# Altium integrated library 兰格封装.IntLib: 1176 symbols (part 4 of 6)
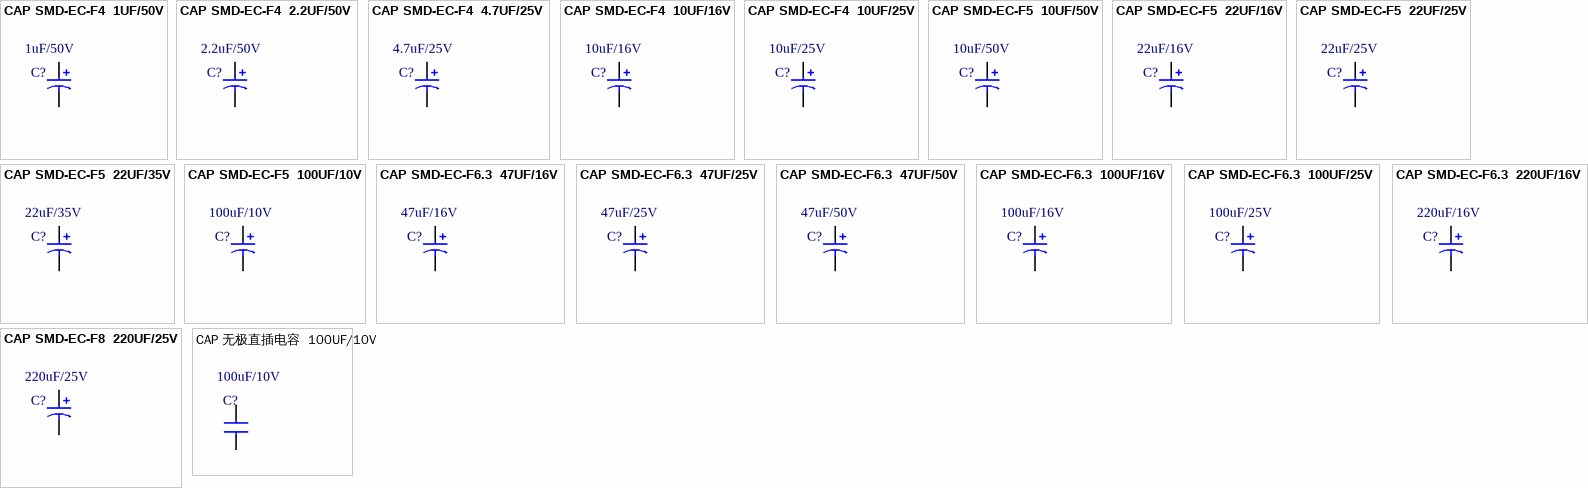
[diagram p51: symbols CAP SMD-EC-F4  1UF/50V to CAP 无极直插电容  100UF/10V]

## CAP SMD-EC-F5  22UF/25V
designator C?, comment 22uF/25V
22UF/25V  贴片铝电容; 物料代码: 3.01.02.02.04.0018; 规格型号: 5*5.4; 助记码: 22UF/25V  TPLDR; 仓库名称: 元件仓; 单位: ֻ; 加工方式: 贴片; 物料名称: 22UF/25V  贴片铝电容
footprint SMD-EC-F5 (0.20 in)
pins: 1, 2
1 alternate drawing of the same symbol

## CAP SMD-EC-F5  22UF/35V
designator C?, comment 22uF/35V
（查不到）22UF/35V  贴片铝电容; 加工方式: 贴片; 仓库名称: 元件仓; 单位: ֻ; 物料代码: *; 物料名称: *; 助记码: *; 规格型号: *; 备注: *
footprint SMD-EC-F5 (0.20 in)
pins: 1, 2
1 alternate drawing of the same symbol

## CAP SMD-EC-F5  100UF/10V
designator C?, comment 100uF/10V
100UF/10V  贴片铝电容; 助记码: 100UF/10V  TPLDR; 物料代码: 3.01.02.02.04.0016; 仓库名称: 元件仓; 规格型号: 5*5.4; 单位: ֻ; 加工方式: 贴片; 物料名称: 100UF/10V  贴片铝电容
footprint SMD-EC-F5 (0.20 in)
pins: 1, 2
1 alternate drawing of the same symbol

## CAP SMD-EC-F6.3  47UF/16V
designator C?, comment 47uF/16V
47UF/16V  贴片铝电容; 助记码: 47UF/16V  TPLDR; 物料代码: 3.01.02.02.04.0013; 仓库名称: 元件仓; 规格型号: 6.3*5.4; 单位: ֻ; 加工方式: 贴片; 物料名称: 47UF/16V  贴片铝电容
footprint SMD-EC-F6.3 (0.26 in)
pins: 1, 2
1 alternate drawing of the same symbol

## CAP SMD-EC-F6.3  47UF/25V
designator C?, comment 47uF/25V
47UF/25V  贴片铝电容; 物料代码: 3.01.02.02.04.0002; 助记码: 47UF/25V  TPLDR; 规格型号: 6.3*5.4; 仓库名称: 元件仓; 单位: ֻ; 加工方式: 贴片; 物料名称: 47UF/25V  贴片铝电容
footprint SMD-EC-F6.3 (0.26 in)
pins: 1, 2
1 alternate drawing of the same symbol

## CAP SMD-EC-F6.3  47UF/50V
designator C?, comment 47uF/50V
47UF/50V  贴片铝电容; 物料代码: 3.01.02.02.04.0011; 规格型号: 6.3*7; 助记码: 47UF/50V  TPLDR; 仓库名称: 元件仓; 单位: ֻ; 加工方式: 贴片; 物料名称: 47UF/50V  贴片铝电容
footprint SMD-EC-F6.3 (0.26 in)
pins: 1, 2
1 alternate drawing of the same symbol

## CAP SMD-EC-F6.3  100UF/16V
designator C?, comment 100uF/16V
100UF/16V  贴片铝电容; 物料代码: 3.01.02.02.04.0014; 助记码: 100UF/16V  TPLDR; 规格型号: 6.3*5.4; 仓库名称: 元件仓; 单位: ֻ; 加工方式: 贴片; 物料名称: 100UF/16V  贴片铝电容
footprint SMD-EC-F6.3 (0.26 in)
pins: 1, 2
1 alternate drawing of the same symbol

## CAP SMD-EC-F6.3  100UF/25V
designator C?, comment 100uF/25V
100UF/25V  贴片铝电容; 物料代码: 3.01.02.02.04.0008; 规格型号: 6.3*7; 助记码: 100UF/25V  TPLDR; 仓库名称: 元件仓; 单位: ֻ; 加工方式: 贴片; 物料名称: 100UF/25V  贴片铝电容
footprint SMD-EC-F6.3 (0.26 in)
pins: 1, 2
1 alternate drawing of the same symbol

## CAP SMD-EC-F6.3  220UF/16V
designator C?, comment 220uF/16V
220UF/16V  贴片铝电容; 物料代码: 3.01.02.02.04.0017; 规格型号: 6.3*7; 助记码: 220UF/16V  TPLDR; 仓库名称: 元件仓; 单位: ֻ; 加工方式: 贴片; 物料名称: 220UF/16V  贴片铝电容
footprint SMD-EC-F6.3 (0.26 in)
pins: 1, 2
1 alternate drawing of the same symbol

## CAP SMD-EC-F8  220UF/25V
designator C?, comment 220uF/25V
220UF/25V  贴片铝电容; 物料代码: 3.01.02.02.04.0009; 规格型号: 6.3*7; 助记码: 220UF/25V  TPLDR; 仓库名称: 元件仓; 单位: ֻ; 加工方式: 贴片; 物料名称: 220UF/25V  贴片铝电容
footprint SMD-EC-F8 (0.33 in        8*10.2)
pins: 1, 2
1 alternate drawing of the same symbol

## CAP 无极直插电容  100UF/10V
designator C?, comment 100uF/10V
100UF/10V  无极直插电容; 仓库名称: 元件仓; 单位: ֻ; 加工方式: 插件; 物料名称: 100UF/10V  无极直插电容
footprint CAP 5mm
pins: 1, 2
1 alternate drawing of the same symbol


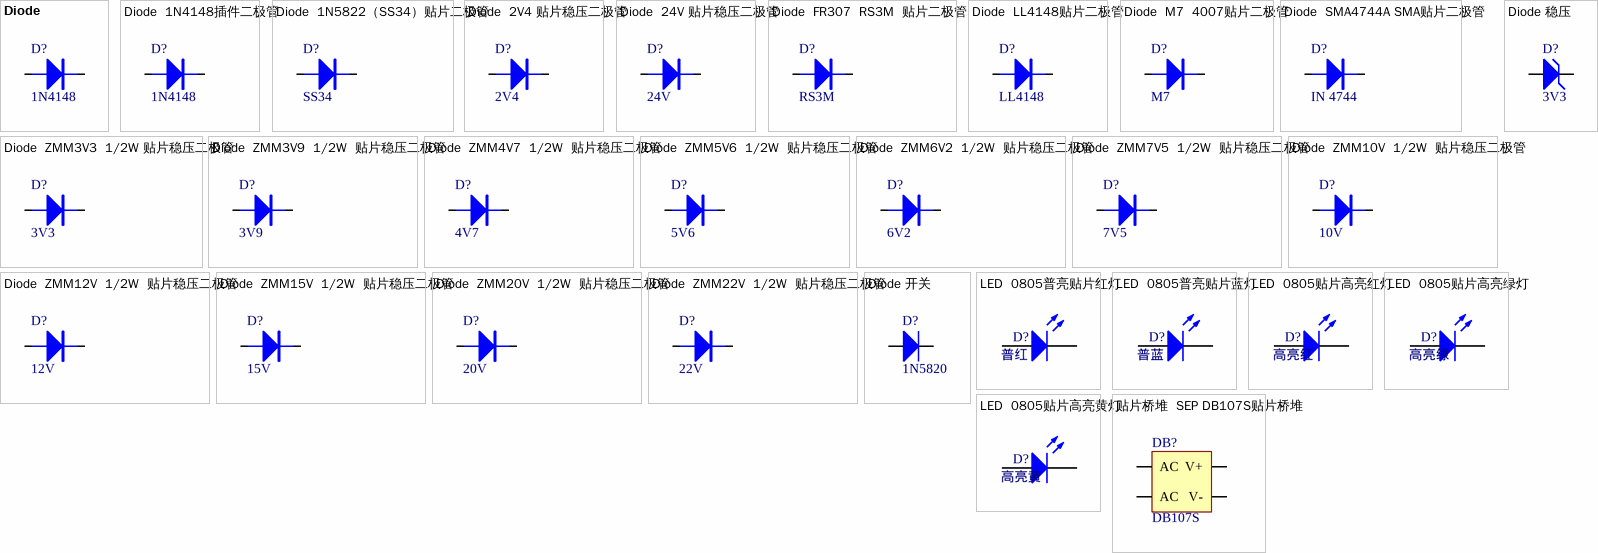
[diagram p32: symbols Diode to 贴片桥堆  SEP DB107S贴片桥堆]

## Diode
designator D?, comment 1N4148
二极管（模板）; 单位: ֻ; 仓库名称: 元件仓; 加工方式: 贴片; 规格型号: *
pins: 1, 2

## Diode  1N4148插件二极管
designator D?, comment 1N4148
1N4148插件二极管; 单位: ֻ; 仓库名称: 元件仓; 加工方式: 插件
footprint IN 34
pins: 1, 2

## Diode  1N5822（SS34）贴片二极管
designator D?, comment SS34
1N5822（SS34）贴片二极管; 单位: ֻ; 规格型号: DO-214AC（SMA）; 物料代码: 3.01.05.02.0029; 助记码: 1N5822（SS34）TPEJG; 仓库名称: 元件仓; 加工方式: 贴片; 物料名称: 1N5822（SS34）贴片二极管
footprint DO-214AC (这是贴片二极管 1A)
pins: 1, 2

## Diode  2V4 贴片稳压二极管
designator D?, comment 2V4
2V4 贴片稳压二极管; 单位: ֻ; 物料代码: 3.01.05.02.0014; 助记码: 2V4 WYEJG; 仓库名称: 元件仓; 加工方式: 贴片; 规格型号: *; 物料名称: 2V4 贴片稳压二极管
footprint LL 34
pins: 1, 2

## Diode  24V 贴片稳压二极管
designator D?, comment 24V
24V 贴片稳压二极管; 单位: ֻ; 物料代码: 3.01.05.02.0013; 助记码: 20V WYEJG; 仓库名称: 元件仓; 加工方式: 贴片; 规格型号: *; 物料名称: 24V 贴片稳压二极管
footprint LL 34
pins: 1, 2

## Diode  FR307  RS3M  贴片二极管
designator D?, comment RS3M
FR307  RS3M  贴片二极管; 单位: ֻ; 规格型号: SMC/DO-214AA; 物料代码: 3.01.05.02.0012; 助记码: FR307  RS3M  TPEJG; 仓库名称: 元件仓; 加工方式: 贴片; 物料名称: FR307  RS3M  贴片二极管
footprint SMC (7.1x5.9*2.3mm（长宽高，不包括引脚）)
pins: 1, 2

## Diode  LL4148贴片二极管
designator D?, comment LL4148
LL4148贴片二极管; 单位: ֻ; 规格型号: LL-34; 物料名称: 1N4148贴片二极管; 物料代码: 3.01.05.02.0004; 助记码: 1N4148TPEJG; 仓库名称: 元件仓; 加工方式: 贴片
footprint LL 34
pins: 1, 2

## Diode  M7  4007贴片二极管
designator D?, comment M7
M7  4007贴片二极管; 单位: ֻ; 规格型号: DO-214; 物料代码: 3.01.05.02.0002; 助记码: M7  4007TPEJG; 仓库名称: 元件仓; 加工方式: 贴片; 物料名称: M7  4007贴片二极管
footprint M7
pins: 1, 2

## Diode  SMA4744A SMA贴片二极管
designator D?, comment IN 4744
SMA4744A SMA贴片二极管; 单位: ֻ; 规格型号: SMA/DO-214AC; 物料代码: 3.01.05.02.0003; 仓库名称: 元件仓; 加工方式: 贴片; 物料名称: SMA4744A SMA贴片二极管
footprint SMA (4.5x2.6*2.2mm（长宽高，不包括引脚）)
pins: 1, 2

## Diode  ZMM3V3  1/2W 贴片稳压二极管
designator D?, comment 3V3
ZMM3V3  1/2W 贴片稳压二极管; 单位: ֻ; 规格型号: LL-34; 物料代码: 3.01.05.02.0001; 仓库名称: 元件仓; 加工方式: 贴片; 物料名称: ZMM3V3  1/2W 贴片稳压二极管
footprint LL 34
pins: 1, 2

## Diode  ZMM3V9  1/2W  贴片稳压二极管
designator D?, comment 3V9
ZMM3V9　1/2W  贴片稳压二极管; 单位: ֻ; 规格型号: LL-34; 物料代码: 3.01.05.02.0005; 助记码: ZMM3V9　1/2W  TPWYEJ; 仓库名称: 元件仓; 加工方式: 贴片; 物料名称: ZMM3V9　1/2W  贴片稳压二极管
footprint LL 34
pins: 1, 2

## Diode  ZMM4V7  1/2W  贴片稳压二极管
designator D?, comment 4V7
ZMM4V7  1/2W  贴片稳压二极管; 单位: ֻ; 规格型号: LL-34; 物料代码: 3.01.05.02.0006; 助记码: ZMM4V7  1/2W  TPWYEJ; 仓库名称: 元件仓; 加工方式: 贴片; 物料名称: ZMM4V7  1/2W  贴片稳压二极管
footprint LL 34
pins: 1, 2

## Diode  ZMM5V6  1/2W  贴片稳压二极管
designator D?, comment 5V6
ZMM5V6  1/2W  贴片稳压二极管; 单位: ֻ; 规格型号: LL-34; 物料代码: 3.01.05.02.0025; 助记码: ZMM5V6  1/2W  TPWYEJ; 仓库名称: 元件仓; 加工方式: 贴片; 物料名称: ZMM5V6  1/2W  贴片稳压二极管
footprint LL 34
pins: 1, 2

## Diode  ZMM6V2  1/2W  贴片稳压二极管
designator D?, comment 6V2
ZMM6V2  1/2W  贴片稳压二极管; 单位: ֻ; 规格型号: LL-34; 物料代码: 3.01.05.02.0007; 助记码: ZMM6V2  1/2W  TPWYEJ; 仓库名称: 元件仓; 加工方式: 贴片; 物料名称: ZMM6V2  1/2W  贴片稳压二极管
footprint LL 34
pins: 1, 2

## Diode  ZMM7V5  1/2W  贴片稳压二极管
designator D?, comment 7V5
（查不到）ZMM7V5  1/2W  贴片稳压二极管; 单位: ֻ; 物料名称: ZMM10V  1/2W  贴片稳压二极管; 仓库名称: 元件仓; 加工方式: 贴片; 规格型号: *
footprint LL 34
pins: 1, 2

## Diode  ZMM10V  1/2W  贴片稳压二极管
designator D?, comment 10V
ZMM10V  1/2W  贴片稳压二极管; 单位: ֻ; 规格型号: LL-34; 物料代码: 3.01.05.02.0008; 助记码: ZMM10V  1/2W  TPWYEJ; 仓库名称: 元件仓; 加工方式: 贴片; 物料名称: ZMM10V  1/2W  贴片稳压二极管
footprint LL 34
pins: 1, 2

## Diode  ZMM12V  1/2W  贴片稳压二极管
designator D?, comment 12V
（查不到）ZMM12V  1/2W  贴片稳压二极管; 单位: ֻ; 仓库名称: 元件仓; 加工方式: 贴片; 规格型号: *; 物料名称: ZMM12V  1/2W  贴片稳压二极管
footprint LL 34
pins: 1, 2

## Diode  ZMM15V  1/2W  贴片稳压二极管
designator D?, comment 15V
（查不到）ZMM15V  1/2W  贴片稳压二极管; 单位: ֻ; 仓库名称: 元件仓; 加工方式: 贴片; 规格型号: *; 物料名称: ZMM15V  1/2W  贴片稳压二极管
footprint LL 34
pins: 1, 2

## Diode  ZMM20V  1/2W  贴片稳压二极管
designator D?, comment 20V
ZMM20V  1/2W  贴片稳压二极管; 单位: ֻ; 规格型号: LL-34; 物料代码: 3.01.05.02.0009; 助记码: ZMM20V  1/2W  TPWYEJ; 仓库名称: 元件仓; 加工方式: 贴片; 物料名称: ZMM20V  1/2W  贴片稳压二极管
footprint LL 34
pins: 1, 2

## Diode  ZMM22V  1/2W  贴片稳压二极管
designator D?, comment 22V
ZMM22V  1/2W  贴片稳压二极管; 单位: ֻ; 规格型号: LL-34; 物料代码: 3.01.05.02.0010; 助记码: ZMM22V  1/2W  TPWYEJ; 仓库名称: 元件仓; 加工方式: 贴片; 物料名称: ZMM22V  1/2W  贴片稳压二极管
footprint LL 34
pins: 1, 2

## Diode 开关
designator D?, comment 1N5820
玻封二极管（模板）; 加工方式: 贴片
footprint D 0805
pins: 1, 2

## Diode 稳压
designator D?, comment 3V3
玻封二极管（模板）; Published: 8-Jun-2000; Revision: July-2002: Re-released for DXP Platform.; Publisher: Altium Limited
footprint LL 34
pins: 1, 2

## LED  0805普亮贴片红灯
designator D?, comment 普红
0805普亮贴片红灯; 单位: ֻ; 物料代码: 3.01.13.01.0001; 助记码: 0805PLTPHD; 仓库名称: 元件仓; 加工方式: 贴片; 物料名称: 0805普亮贴片红灯; 规格型号: *
footprint LED 0805 (普通亮度，高亮绿灯用)
pins: 1 A, 2 K

## LED  0805普亮贴片蓝灯
designator D?, comment 普蓝
0805普亮贴片蓝灯; 单位: ֻ; 仓库名称: 元件仓; 加工方式: 贴片; 物料名称: 0805普亮贴片蓝灯; 规格型号: *
footprint LED 0805 (普通亮度，高亮绿灯用)
pins: 1 A, 2 K

## LED  0805贴片高亮红灯
designator D?, comment 高亮红
0805贴片高亮红灯; 单位: ֻ; 物料代码: 3.01.13.01.0005; 助记码: 0805TPGLHD; 规格型号: E6U0805URAC1UDA; 仓库名称: 元件仓; 加工方式: 贴片; 物料名称: 0805贴片高亮红灯
footprint LED 0805   反极性 (极性相反；高亮红，高亮黄专用)
pins: 1 A, 2 K

## LED  0805贴片高亮绿灯
designator D?, comment 高亮绿
0805贴片高亮绿灯; 单位: ֻ; 仓库名称: 元件仓; 加工方式: 贴片; 物料名称: 0805贴片高亮绿灯; 规格型号: *
footprint LED 0805 (普通亮度，高亮绿灯用)
pins: 1 A, 2 K

## LED  0805贴片高亮黄灯
designator D?, comment 高亮黄
0805贴片高亮黄灯; 单位: ֻ; 仓库名称: 元件仓; 加工方式: 贴片; 物料名称: 0805贴片高亮黄灯; 规格型号: *
footprint LED 0805   反极性 (极性相反；高亮红，高亮黄专用)
pins: 1 A, 2 K

## 贴片桥堆  SEP DB107S贴片桥堆
designator DB?, comment DB107S
SEP DB107S贴片桥堆; 物料代码: 3.01.17.02.0001; 助记码: SOP-4; 规格型号: SEP DB107STPQD; 仓库名称: 元件仓; 单位: ֻ; 加工方式: 贴片; 物料名称: SEP DB107S贴片桥堆; 备注: *
footprint SOP-4 (贴片桥堆DB107S)
pins: 1 AC, 2 AC, 3 V+, 4 V-


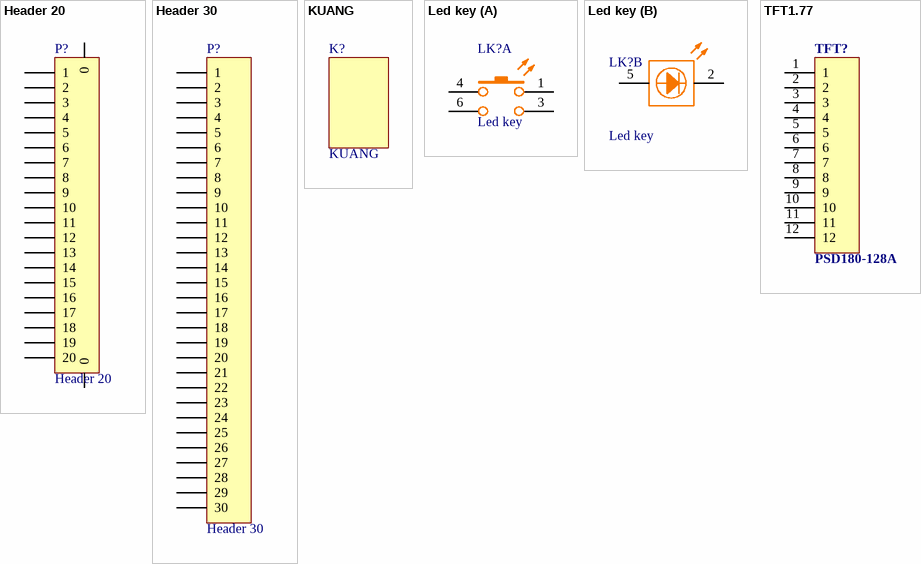
[diagram p33: symbols Header 20 to TFT1.77]

## Header 20
designator P?
Header, 20-Pin; LatestRevisionDate: 17-Jul-2002; LatestRevisionNote: Re-released for DXP Platform.; Publisher: Altium Limited
footprint 2.2寸 (3600 disp II)
pins: 0, 0, 1, 2, 3, 4, 5, 6, 7, 8, 9, 10, 11, 12, 13, 14, 15, 16, 17, 18, 19, 20

## Header 30
designator P?
Header, 30-Pin; LatestRevisionDate: 17-Jul-2002; LatestRevisionNote: Re-released for DXP Platform.; Publisher: Altium Limited
footprint 0.98寸
pins: 1, 2, 3, 4, 5, 6, 7, 8, 9, 10, 11, 12, 13, 14, 15, 16, 17, 18, 19, 20, 21, 22, 23, 24, 25, 26, 27, 28, 29, 30

## KUANG
designator K?
3600用
footprint 轻触开关 2P 带灯

## Led key
designator LK?
footprint LK (led key)
part A pins: 1 SW, 3 SW, 4 SW, 6 SW
part B pins: 2, 5

## TFT1.77
designator TFT?, comment PSD180-128A
3022屏幕
footprint 1.8寸
pins: 1, 2, 3, 4, 5, 6, 7, 8, 9, 10, 11, 12


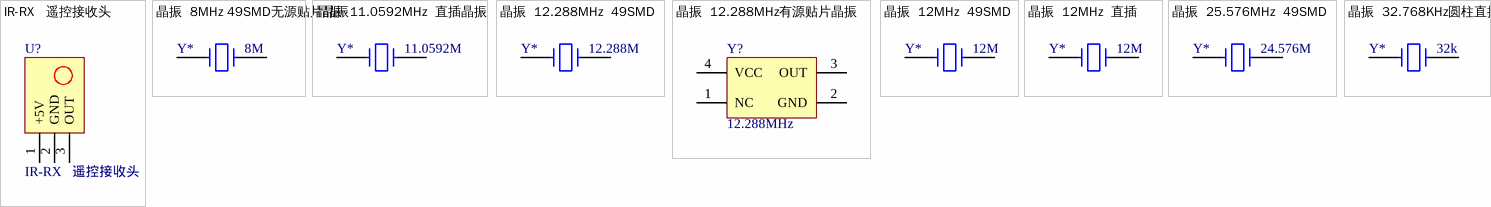
[diagram p34: symbols IR-RX   遥控接收头 to 晶振  32.768KHz圆柱直插晶振]

## IR-RX   遥控接收头
designator U?
遥控接收头 小体积; 物料代码: 3.01.04.01.0007; 物料名称: CH1838遥控接收头; 助记码: CH1838YKJST; 单位: ֻ; 仓库名称: 元件仓; 加工方式: 插件; 备注: *
footprint HS0038
pins: 1 +5V, 2 GND, 3 OUT
2 alternate drawings of the same symbol

## 晶振  8MHz 49SMD无源贴片晶振
designator Y*, comment 8M
8MHz 49SMD无源贴片晶振; 物料代码: 3.01.07.02.0003; 助记码: 8MHZ 49SMDWYTPJZ; 仓库名称: 元件仓; 单位: ֻ; 规格型号: 二脚 20PPM; 加工方式: 贴片; 物料名称: 8MHZ 49SMD无源贴片晶振
footprint 晶振   4*8
pins: 1, 2

## 晶振  11.0592MHz  直插晶振
designator Y*, comment 11.0592M
（未入库）11.0592MHz; 仓库名称: 元件仓; 单位: ֻ; 加工方式: 插件
footprint XTAL(HC-49)
pins: 1, 2

## 晶振  12.288MHz  49SMD
designator Y*, comment 12.288M
（未入库）12.288MHz  49SMD; 仓库名称: 元件仓; 单位: ֻ; 加工方式: 贴片
footprint 晶振   4*8
pins: 1, 2

## 晶振  12.288MHz有源贴片晶振
designator Y?, comment 12.288MHz
12.288MHz有源贴片晶振; 物料代码: 3.01.07.02.0002; 加工方式: 贴片; 助记码: 5070 四脚 20PPM; 规格型号: 12.288MHZYYTPJZ; 单位: ֻ; 仓库名称: 元件仓; 物料名称: 12.288MHZ有源贴片晶振; 备注: *
footprint 晶振   有源7050
pins: 1 NC, 2 GND, 3 OUT, 4 VCC

## 晶振  12MHz  49SMD
designator Y*, comment 12M
（未入库）12MHz  49SMD; 仓库名称: 元件仓; 单位: ֻ; 加工方式: 贴片
footprint 晶振   4*8
pins: 1, 2

## 晶振  12MHz  直插
designator Y*, comment 12M
（未入库）12MHz  直插; 仓库名称: 元件仓; 单位: ֻ; 加工方式: 插件
footprint XTAL(HC-49)
pins: 1, 2

## 晶振  25.576MHz  49SMD
designator Y*, comment 24.576M
（未入库）25.576MHz  49SMD; 仓库名称: 元件仓; 单位: ֻ; 加工方式: 贴片
footprint 晶振   4*8
pins: 1, 2

## 晶振  32.768KHz圆柱直插晶振
designator Y*, comment 32k
32.768KHz圆柱直插晶振; 物料代码: 3.01.07.01.0003; 助记码: 3*8 10PPM; 规格型号: 32.768KHzYZZCJZ; 仓库名称: 元件仓; 单位: ֻ; 加工方式: 插件; 物料名称: 32.768KHz圆柱直插晶振; 备注: *
footprint 晶振   圆柱型3*8mm (3*8MM)
pins: 1, 2


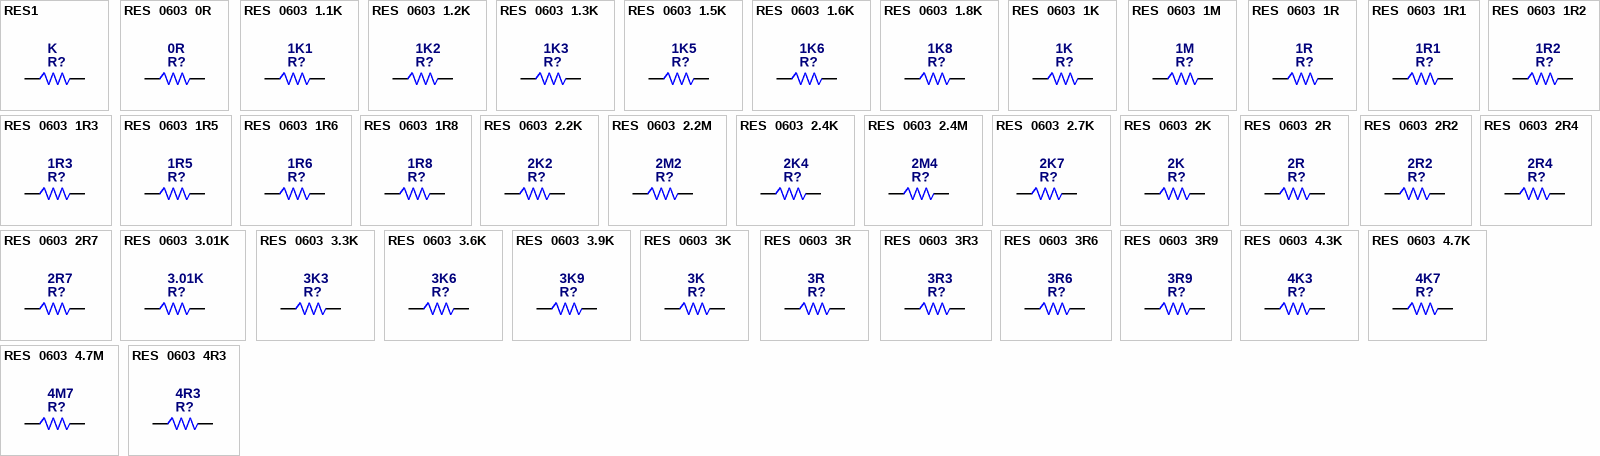
[diagram p35: symbols RES1 to RES  0603  4R3]

## RES1
designator R?, comment K
1206  K  5%  HS  贴片电阻
footprint R1206
pins: 1, 2
2 alternate drawings of the same symbol

## RES  0603  0R
designator R?, comment 0R
0603  0R  5%  贴片电阻; 物料代码: 3.01.03.01.01.0042; 仓库名称: 元件仓; 助记码: 0603  0R  5%  TPDZ; 单位: ֻ; 加工方式: 贴片; 物料名称: 0603  0R  5%  贴片电阻; 规格型号: *
footprint R0603
pins: 1, 2
2 alternate drawings of the same symbol

## RES  0603  1.1K
designator R?, comment 1K1
0603 1.1K 5% 贴片电阻; 物料代码: 3.01.03.01.01.0105; 助记码: 0603 1.1K 5% TPDZ; 仓库名称: 元件仓; 单位: ֻ; 加工方式: 贴片; 物料名称: 0603 1.1K 5% 贴片电阻; 规格型号: *
footprint R0603
pins: 1, 2
2 alternate drawings of the same symbol

## RES  0603  1.2K
designator R?, comment 1K2
0603  1.2K  5%  贴片电阻; 助记码: 0603  1.2K  5%  TPDZ; 物料代码: 3.01.03.01.01.0024; 仓库名称: 元件仓; 单位: ֻ; 加工方式: 贴片; 物料名称: 0603  1.2K  5%  贴片电阻; 规格型号: *
footprint R0603
pins: 1, 2
2 alternate drawings of the same symbol

## RES  0603  1.3K
designator R?, comment 1K3
0603 1.3K 5% 贴片电阻; 助记码: 0603 1.3K 5% TPDZ; 物料代码: 3.01.03.01.01.0145; 仓库名称: 元件仓; 单位: ֻ; 加工方式: 贴片; 物料名称: 0603 1.3K 5% 贴片电阻; 规格型号: *
footprint R0603
pins: 1, 2
2 alternate drawings of the same symbol

## RES  0603  1.5K
designator R?, comment 1K5
0603  1.5K  5%  贴片电阻; 助记码: 0603  1.5K  5%  TPDZ; 仓库名称: 元件仓; 物料代码: 3.01.03.01.01.0001; 单位: ֻ; 加工方式: 贴片; 物料名称: 0603  1.5K  5%  贴片电阻; 规格型号: *
footprint R0603
pins: 1, 2
2 alternate drawings of the same symbol

## RES  0603  1.6K
designator R?, comment 1K6
0603 1.6K 5% 贴片电阻; 助记码: 0603 1.6K 5% TPDZ; 仓库名称: 元件仓; 物料代码: 3.01.03.01.01.0106; 单位: ֻ; 加工方式: 贴片; 物料名称: 0603 1.6K 5% 贴片电阻; 规格型号: *
footprint R0603
pins: 1, 2
2 alternate drawings of the same symbol

## RES  0603  1.8K
designator R?, comment 1K8
0603 1.8K 5% 贴片电阻; 助记码: 0603 1.8K 5% TPDZ; 仓库名称: 元件仓; 物料代码: 3.01.03.01.01.0043; 单位: ֻ; 加工方式: 贴片; 物料名称: 0603 1.8K 5% 贴片电阻; 规格型号: *
footprint R0603
pins: 1, 2
2 alternate drawings of the same symbol

## RES  0603  1K
designator R?, comment 1K
0603  1K  5%  贴片电阻; 物料代码: 3.01.03.01.01.0023; 助记码: 0603  1K  5%  TPDZ; 仓库名称: 元件仓; 单位: ֻ; 加工方式: 贴片; 物料名称: 0603  1K  5%  贴片电阻; 规格型号: *
footprint R0603
pins: 1, 2
2 alternate drawings of the same symbol

## RES  0603  1M
designator R?, comment 1M
0603  1M  5%  贴片电阻; 助记码: 0603  1M  5%  TPDZ; 物料代码: 3.01.03.01.01.0036; 仓库名称: 元件仓; 加工方式: 贴片; 单位: ֻ; 物料名称: 0603  1M  5%  贴片电阻; 规格型号: *
footprint R0603
pins: 1, 2
2 alternate drawings of the same symbol

## RES  0603  1R
designator R?, comment 1R
0603 1R 5% 贴片电阻; 物料代码: 3.01.03.01.01.0076; 仓库名称: 元件仓; 助记码: 0603 1R 5% TPDZ; 单位: ֻ; 加工方式: 贴片; 物料名称: 0603 1R 5% 贴片电阻; 规格型号: *
footprint R0603
pins: 1, 2
2 alternate drawings of the same symbol

## RES  0603  1R1
designator R?, comment 1R1
0603 1R1 5% 贴片电阻; 物料代码: 3.01.03.01.01.0077; 仓库名称: 元件仓; 助记码: 0603 1R1 5% TPDZ; 单位: ֻ; 加工方式: 贴片; 物料名称: 0603 1R1 5% 贴片电阻; 规格型号: *
footprint R0603
pins: 1, 2
2 alternate drawings of the same symbol

## RES  0603  1R2
designator R?, comment 1R2
0603 1R2 5% 贴片电阻; 物料代码: 3.01.03.01.01.0148; 仓库名称: 元件仓; 助记码: 0603 1R2 5% TPDZ; 单位: ֻ; 加工方式: 贴片; 物料名称: 0603 1R2 5% 贴片电阻; 规格型号: *
footprint R0603
pins: 1, 2
2 alternate drawings of the same symbol

## RES  0603  1R3
designator R?, comment 1R3
0603 1R3 5% 贴片电阻; 物料代码: 3.01.03.01.01.0153; 仓库名称: 元件仓; 助记码: 0603 1R3 5% TPDZ; 单位: ֻ; 加工方式: 贴片; 物料名称: 0603 1R3 5% 贴片电阻; 规格型号: *
footprint R0603
pins: 1, 2
2 alternate drawings of the same symbol

## RES  0603  1R5
designator R?, comment 1R5
0603 1R5 5% 贴片电阻; 物料代码: 3.01.03.01.01.0140; 仓库名称: 元件仓; 助记码: 0603 1R5 5% TPDZ; 单位: ֻ; 加工方式: 贴片; 物料名称: 0603 1R5 5% 贴片电阻; 规格型号: *
footprint R0603
pins: 1, 2
2 alternate drawings of the same symbol

## RES  0603  1R6
designator R?, comment 1R6
0603 1R6 5% 贴片电阻; 物料代码: 3.01.03.01.01.0149; 仓库名称: 元件仓; 助记码: 0603 1R6 5% TPDZ; 单位: ֻ; 加工方式: 贴片; 物料名称: 0603 1R6 5% 贴片电阻; 规格型号: *
footprint R0603
pins: 1, 2
2 alternate drawings of the same symbol

## RES  0603  1R8
designator R?, comment 1R8
0603 1R8 5% 贴片电阻; 物料代码: 3.01.03.01.01.0113; 仓库名称: 元件仓; 助记码: 0603 1R8 5% TPDZ; 单位: ֻ; 加工方式: 贴片; 物料名称: 0603 1R8 5% 贴片电阻; 规格型号: *
footprint R0603
pins: 1, 2
2 alternate drawings of the same symbol

## RES  0603  2.2K
designator R?, comment 2K2
0603 2.2K 5% 贴片电阻; 助记码: 0603 2.2K 5% TPDZ; 物料代码: 3.01.03.01.01.0021; 仓库名称: 元件仓; 单位: ֻ; 加工方式: 贴片; 物料名称: 0603 2.2K 5% 贴片电阻; 规格型号: *
footprint R0603
pins: 1, 2
2 alternate drawings of the same symbol

## RES  0603  2.2M
designator R?, comment 2M2
0603 2.2M 5% 贴片电阻; 助记码: 0603 2.2M 5% TPDZ; 物料代码: 3.01.03.01.01.0037; 仓库名称: 元件仓; 单位: ֻ; 加工方式: 贴片; 物料名称: 0603 2.2M 5% 贴片电阻; 规格型号: *
footprint R0603
pins: 1, 2
2 alternate drawings of the same symbol

## RES  0603  2.4K
designator R?, comment 2K4
0603 2.4K 5% 贴片电阻; 助记码: 0603 2.4K 5% TPDZ; 物料代码: 3.01.03.01.01.0044; 仓库名称: 元件仓; 单位: ֻ; 加工方式: 贴片; 物料名称: 0603 2.4K 5% 贴片电阻; 规格型号: *
footprint R0603
pins: 1, 2
2 alternate drawings of the same symbol

## RES  0603  2.4M
designator R?, comment 2M4
0603 2.4M 5% 贴片电阻; 助记码: 0603 2.4M 5% TPDZ; 物料代码: 3.01.03.01.01.0114; 仓库名称: 元件仓; 单位: ֻ; 加工方式: 贴片; 物料名称: 0603 2.4M 5% 贴片电阻; 规格型号: *
footprint R0603
pins: 1, 2
2 alternate drawings of the same symbol

## RES  0603  2.7K
designator R?, comment 2K7
0603 2.7K 5% 贴片电阻; 助记码: 0603 2.7K 5% TPDZ; 物料代码: 3.01.03.01.01.0045; 仓库名称: 元件仓; 单位: ֻ; 加工方式: 贴片; 物料名称: 0603 2.7K 5% 贴片电阻; 规格型号: *
footprint R0603
pins: 1, 2
2 alternate drawings of the same symbol

## RES  0603  2K
designator R?, comment 2K
0603  2K  5%  贴片电阻; 助记码: 0603  2K  5%  TPDZ; 物料代码: 3.01.03.01.01.0020; 仓库名称: 元件仓; 单位: ֻ; 加工方式: 贴片; 物料名称: 0603  2K  5%  贴片电阻; 规格型号: *
footprint R0603
pins: 1, 2
2 alternate drawings of the same symbol

## RES  0603  2R
designator R?, comment 2R
0603 2R 5% 贴片电阻; 物料代码: 3.01.03.01.01.0115; 助记码: 0603 2R 5% TPDZ; 仓库名称: 元件仓; 单位: ֻ; 加工方式: 贴片; 物料名称: 0603 2R 5% 贴片电阻; 规格型号: *
footprint R0603
pins: 1, 2
2 alternate drawings of the same symbol

## RES  0603  2R2
designator R?, comment 2R2
0603  2R2  5%  贴片电阻; 物料代码: 3.01.03.01.01.0022; 助记码: 0603  2R2  5%  TPDZ; 仓库名称: 元件仓; 单位: ֻ; 加工方式: 贴片; 物料名称: 0603  2R2  5%  贴片电阻; 规格型号: *
footprint R0603
pins: 1, 2
2 alternate drawings of the same symbol

## RES  0603  2R4
designator R?, comment 2R4
0603 2R4 5% 贴片电阻; 物料代码: 3.01.03.01.01.0116; 助记码: 0603 2R4 5% TPDZ; 仓库名称: 元件仓; 单位: ֻ; 加工方式: 贴片; 物料名称: 0603 2R4 5% 贴片电阻; 规格型号: *
footprint R0603
pins: 1, 2
2 alternate drawings of the same symbol

## RES  0603  2R7
designator R?, comment 2R7
0603 2R7 5% 贴片电阻; 物料代码: 3.01.03.01.01.0117; 助记码: 0603 2R7 5% TPDZ; 仓库名称: 元件仓; 单位: ֻ; 加工方式: 贴片; 物料名称: 0603 2R7 5% 贴片电阻; 规格型号: *
footprint R0603
pins: 1, 2
2 alternate drawings of the same symbol

## RES  0603  3.01K
designator R?, comment 3.01K
0603 3.01K 1% 贴片电阻; 物料代码: 3.01.03.01.01.0002; 仓库名称: 元件仓; 单位: ֻ; 加工方式: 贴片; 物料名称: 0603 3.01K 1% 贴片电阻; 规格型号: *
footprint R0603
pins: 1, 2
2 alternate drawings of the same symbol

## RES  0603  3.3K
designator R?, comment 3K3
0603  3.3K  5%  贴片电阻; 物料代码: 3.01.03.01.01.0047; 助记码: 0603  3.3K  5%  TPDZ; 仓库名称: 元件仓; 单位: ֻ; 加工方式: 贴片; 物料名称: 0603  3.3K  5%  贴片电阻; 规格型号: *
footprint R0603
pins: 1, 2
2 alternate drawings of the same symbol

## RES  0603  3.6K
designator R?, comment 3K6
0603 3.6K 5% 贴片电阻; 物料代码: 3.01.03.01.01.0048; 助记码: 0603 3.6K 5% TPDZ; 仓库名称: 元件仓; 单位: ֻ; 加工方式: 贴片; 物料名称: 0603 3.6K 5% 贴片电阻; 规格型号: *
footprint R0603
pins: 1, 2
2 alternate drawings of the same symbol

## RES  0603  3.9K
designator R?, comment 3K9
0603 3.9K 5% 贴片电阻; 物料代码: 3.01.03.01.01.0035; 助记码: 0603 3.9K 5% TPDZ; 仓库名称: 元件仓; 单位: ֻ; 加工方式: 贴片; 物料名称: 0603 3.9K 5% 贴片电阻; 规格型号: *
footprint R0603
pins: 1, 2
2 alternate drawings of the same symbol

## RES  0603  3K
designator R?, comment 3K
0603 3K 5% 贴片电阻; 物料代码: 3.01.03.01.01.0046; 助记码: 0603 3K 5% TPDZ; 仓库名称: 元件仓; 单位: ֻ; 加工方式: 贴片; 物料名称: 0603 3K 5% 贴片电阻; 规格型号: *
footprint R0603
pins: 1, 2
2 alternate drawings of the same symbol

## RES  0603  3R
designator R?, comment 3R
0603 3R 5% 贴片电阻; 物料代码: 3.01.03.01.01.0141; 助记码: 0603 3R 5% TPDZ; 仓库名称: 元件仓; 单位: ֻ; 加工方式: 贴片; 物料名称: 0603 3R 5% 贴片电阻; 规格型号: *
footprint R0603
pins: 1, 2
2 alternate drawings of the same symbol

## RES  0603  3R3
designator R?, comment 3R3
0603 3R3 5% 贴片电阻; 物料代码: 3.01.03.01.01.0118; 助记码: 0603 3R3 5% TPDZ; 仓库名称: 元件仓; 单位: ֻ; 加工方式: 贴片; 物料名称: 0603 3R3 5% 贴片电阻; 规格型号: *
footprint R0603
pins: 1, 2
2 alternate drawings of the same symbol

## RES  0603  3R6
designator R?, comment 3R6
0603 3R6 5% 贴片电阻; 物料代码: 3.01.03.01.01.0154; 助记码: 0603 3R6 5% TPDZ; 仓库名称: 元件仓; 单位: ֻ; 加工方式: 贴片; 物料名称: 0603 3R6 5% 贴片电阻; 规格型号: *
footprint R0603
pins: 1, 2
2 alternate drawings of the same symbol

## RES  0603  3R9
designator R?, comment 3R9
0603 3R9 5% 贴片电阻; 物料代码: 3.01.03.01.01.0078; 助记码: 0603 3R9 5% TPDZ; 仓库名称: 元件仓; 单位: ֻ; 加工方式: 贴片; 物料名称: 0603 3R9 5% 贴片电阻; 规格型号: *
footprint R0603
pins: 1, 2
2 alternate drawings of the same symbol

## RES  0603  4.3K
designator R?, comment 4K3
0603 4.3K 5% 贴片电阻; 物料代码: 3.01.03.01.01.0049; 助记码: 0603 4.3K 5% TPDZ; 仓库名称: 元件仓; 单位: ֻ; 加工方式: 贴片; 物料名称: 0603 4.3K 5% 贴片电阻; 规格型号: *
footprint R0603
pins: 1, 2
2 alternate drawings of the same symbol

## RES  0603  4.7K
designator R?, comment 4K7
0603  4.7K  5%  贴片电阻; 物料代码: 3.01.03.01.01.0003; 仓库名称: 元件仓; 单位: ֻ; 加工方式: 贴片; 物料名称: 0603  4.7K  5%  贴片电阻; 规格型号: *; 助记码: *
footprint R0603
pins: 1, 2
2 alternate drawings of the same symbol

## RES  0603  4.7M
designator R?, comment 4M7
0603 4.7M 5% 贴片电阻; 物料代码: 3.01.03.01.01.0074; 助记码: 0603 4.7M 5% TPDZ; 仓库名称: 元件仓; 单位: ֻ; 加工方式: 贴片; 物料名称: 0603 4.7M 5% 贴片电阻; 规格型号: *
footprint R0603
pins: 1, 2
2 alternate drawings of the same symbol

## RES  0603  4R3
designator R?, comment 4R3
0603 4R3 5% 贴片电阻; 物料代码: 3.01.03.01.01.0119; 仓库名称: 元件仓; 助记码: 0603 4R3 5% TPDZ; 单位: ֻ; 加工方式: 贴片; 物料名称: 0603 4R3 5% 贴片电阻; 规格型号: *
footprint R0603
pins: 1, 2
2 alternate drawings of the same symbol

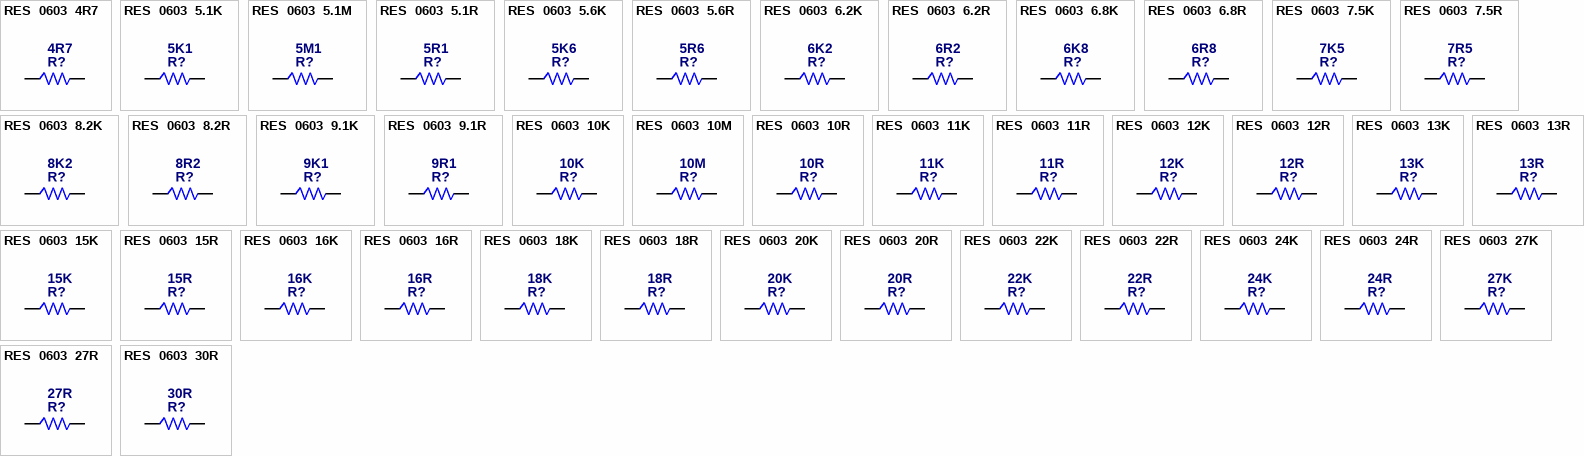
[diagram p36: symbols RES  0603  4R7 to RES  0603  30R]

## RES  0603  4R7
designator R?, comment 4R7
0603  4R7  5%  贴片电阻; 物料代码: 3.01.03.01.01.0079; 仓库名称: 元件仓; 助记码: 0603  4R7  5%  TPDZ; 单位: ֻ; 加工方式: 贴片; 物料名称: 0603  4R7  5%  贴片电阻; 规格型号: *
footprint R0603
pins: 1, 2
2 alternate drawings of the same symbol

## RES  0603  5.1K
designator R?, comment 5K1
0603  5.1K  5%  贴片电阻; 物料代码: 3.01.03.01.01.0050; 助记码: 0603  5.1K  5%  TPDZ; 仓库名称: 元件仓; 单位: ֻ; 加工方式: 贴片; 物料名称: 0603  5.1K  5%  贴片电阻; 规格型号: *
footprint R0603
pins: 1, 2
2 alternate drawings of the same symbol

## RES  0603  5.1M
designator R?, comment 5M1
0603 5.1M 5% 贴片电阻; 物料代码: 3.01.03.01.01.0152; 助记码: 0603 5.1M 5% TPDZ; 仓库名称: 元件仓; 单位: ֻ; 加工方式: 贴片; 物料名称: 0603 5.1M 5% 贴片电阻; 规格型号: *
footprint R0603
pins: 1, 2
2 alternate drawings of the same symbol

## RES  0603  5.1R
designator R?, comment 5R1
0603 5R1 5% 贴片电阻; 物料代码: 3.01.03.01.01.0120; 助记码: 0603 5R1 5% TPDZ; 仓库名称: 元件仓; 单位: ֻ; 加工方式: 贴片; 物料名称: 0603 5R1 5% 贴片电阻; 规格型号: *
footprint R0603
pins: 1, 2
2 alternate drawings of the same symbol

## RES  0603  5.6K
designator R?, comment 5K6
0603  5.6K  5%  贴片电阻; 助记码: 0603  5.6K  5%  TPDZ; 物料代码: 3.01.03.01.01.0051; 仓库名称: 元件仓; 单位: ֻ; 加工方式: 贴片; 物料名称: 0603  5.6K  5%  贴片电阻; 规格型号: *
footprint R0603
pins: 1, 2
2 alternate drawings of the same symbol

## RES  0603  5.6R
designator R?, comment 5R6
0603 5R6 5% 贴片电阻; 助记码: 0603 5R6 5% TPDZ; 物料代码: 3.01.03.01.01.0132; 仓库名称: 元件仓; 单位: ֻ; 加工方式: 贴片; 物料名称: 0603 5R6 5% 贴片电阻; 规格型号: *
footprint R0603
pins: 1, 2
2 alternate drawings of the same symbol

## RES  0603  6.2K
designator R?, comment 6K2
0603 6.2K 5% 贴片电阻; 物料代码: 3.01.03.01.01.0052; 仓库名称: 元件仓; 助记码: 0603 6.2K 5% TPDZ; 单位: ֻ; 加工方式: 贴片; 物料名称: 0603 6.2K 5% 贴片电阻; 规格型号: *
footprint R0603
pins: 1, 2
2 alternate drawings of the same symbol

## RES  0603  6.2R
designator R?, comment 6R2
0603 6R2 5% 贴片电阻; 物料代码: 3.01.03.01.01.0121; 仓库名称: 元件仓; 助记码: 0603 6R2 5% TPDZ; 单位: ֻ; 加工方式: 贴片; 物料名称: 0603 6R2 5% 贴片电阻; 规格型号: *
footprint R0603
pins: 1, 2
2 alternate drawings of the same symbol

## RES  0603  6.8K
designator R?, comment 6K8
0603  6.8K  5%  贴片电阻; 物料代码: 3.01.03.01.01.0004; 仓库名称: 元件仓; 单位: ֻ; 加工方式: 贴片; 物料名称: 0603  6.8K  5%  贴片电阻; 规格型号: *; 助记码: *
footprint R0603
pins: 1, 2
2 alternate drawings of the same symbol

## RES  0603  6.8R
designator R?, comment 6R8
0603 6R8 5% 贴片电阻; 物料代码: 3.01.03.01.01.0122; 仓库名称: 元件仓; 助记码: 0603 6R8 5% TPDZ; 单位: ֻ; 加工方式: 贴片; 物料名称: 0603 6R8 5% 贴片电阻; 规格型号: *
footprint R0603
pins: 1, 2
2 alternate drawings of the same symbol

## RES  0603  7.5K
designator R?, comment 7K5
0603  7.5K  5%  贴片电阻; 助记码: 0603  7.5K  5%  TPDZ; 物料代码: 3.01.03.01.01.0025; 仓库名称: 元件仓; 单位: ֻ; 加工方式: 贴片; 物料名称: 0603  7.5K  5%  贴片电阻; 规格型号: *
footprint R0603
pins: 1, 2
2 alternate drawings of the same symbol

## RES  0603  7.5R
designator R?, comment 7R5
0603 7R5 5% 贴片电阻; 助记码: 0603 7R5 5% TPDZ; 物料代码: 3.01.03.01.01.0123; 仓库名称: 元件仓; 单位: ֻ; 加工方式: 贴片; 物料名称: 0603 7R5 5% 贴片电阻; 规格型号: *
footprint R0603
pins: 1, 2
2 alternate drawings of the same symbol

## RES  0603  8.2K
designator R?, comment 8K2
0603  8.2K  5%  贴片电阻; 物料代码: 3.01.03.01.01.0053; 助记码: 0603  8.2K  5%  TPDZ; 仓库名称: 元件仓; 单位: ֻ; 加工方式: 贴片; 物料名称: 0603  8.2K  5%  贴片电阻; 规格型号: *
footprint R0603
pins: 1, 2
2 alternate drawings of the same symbol

## RES  0603  8.2R
designator R?, comment 8R2
0603 8R2 5% 贴片电阻; 物料代码: 3.01.03.01.01.0133; 助记码: 0603 8R2 5% TPDZ; 仓库名称: 元件仓; 单位: ֻ; 加工方式: 贴片; 物料名称: 0603 8R2 5% 贴片电阻; 规格型号: *
footprint R0603
pins: 1, 2
2 alternate drawings of the same symbol

## RES  0603  9.1K
designator R?, comment 9K1
0603  9.1K  5%  贴片电阻; 物料代码: 3.01.03.01.01.0005; 仓库名称: 元件仓; 单位: ֻ; 加工方式: 贴片; 物料名称: 0603  9.1K  5%  贴片电阻; 助记码: *; 规格型号: *
footprint R0603
pins: 1, 2
2 alternate drawings of the same symbol

## RES  0603  9.1R
designator R?, comment 9R1
0603 9R1 5% 贴片电阻; 物料代码: 3.01.03.01.01.0124; 助记码: 0603 9R1 5% TPDZ; 仓库名称: 元件仓; 单位: ֻ; 加工方式: 贴片; 物料名称: 0603 9R1 5% 贴片电阻; 规格型号: *
footprint R0603
pins: 1, 2
2 alternate drawings of the same symbol

## RES  0603  10K
designator R?, comment 10K
0603  10K  5%  贴片电阻; 物料代码: 3.01.03.01.01.0006; 仓库名称: 元件仓; 单位: ֻ; 加工方式: 贴片; 物料名称: 0603  10K  5%  贴片电阻; 规格型号: *; 助记码: *
footprint R0603
pins: 1, 2
2 alternate drawings of the same symbol

## RES  0603  10M
designator R?, comment 10M
0603 10M 5% 贴片电阻; 物料代码: 3.01.03.01.01.0075; 仓库名称: 元件仓; 助记码: 0603 10M 5% TPDZ; 单位: ֻ; 加工方式: 贴片; 物料名称: 0603 10M 5% 贴片电阻; 规格型号: *
footprint R0603
pins: 1, 2
2 alternate drawings of the same symbol

## RES  0603  10R
designator R?, comment 10R
0603  10R  5%  贴片电阻; 物料代码: 3.01.03.01.01.0019; 助记码: 0603  10R  5%  TPDZ; 仓库名称: 元件仓; 单位: ֻ; 加工方式: 贴片; 物料名称: 0603  10R  5%  贴片电阻; 规格型号: *
footprint R0603
pins: 1, 2
2 alternate drawings of the same symbol

## RES  0603  11K
designator R?, comment 11K
0603  11K  5%  贴片电阻; 物料代码: 3.01.03.01.01.0007; 仓库名称: 元件仓; 单位: ֻ; 加工方式: 贴片; 物料名称: 0603  11K  5%  贴片电阻; 规格型号: *; 助记码: *
footprint R0603
pins: 1, 2
2 alternate drawings of the same symbol

## RES  0603  11R
designator R?, comment 11R
0603 11R 5% 贴片电阻; 物料代码: 3.01.03.01.01.0134; 助记码: 0603 11R 5% TPDZ; 仓库名称: 元件仓; 单位: ֻ; 加工方式: 贴片; 物料名称: 0603 11R 5% 贴片电阻; 规格型号: *
footprint R0603
pins: 1, 2
2 alternate drawings of the same symbol

## RES  0603  12K
designator R?, comment 12K
0603 12K 5% 贴片电阻; 物料代码: 3.01.03.01.01.0054; 仓库名称: 元件仓; 助记码: 0603 12K 5% TPDZ; 单位: ֻ; 加工方式: 贴片; 物料名称: 0603 12K 5% 贴片电阻; 规格型号: *
footprint R0603
pins: 1, 2
2 alternate drawings of the same symbol

## RES  0603  12R
designator R?, comment 12R
0603 12R 5% 贴片电阻; 物料代码: 3.01.03.01.01.0150; 助记码: 0603 12R 5% TPDZ; 仓库名称: 元件仓; 单位: ֻ; 加工方式: 贴片; 物料名称: 0603 12R 5% 贴片电阻; 规格型号: *
footprint R0603
pins: 1, 2
2 alternate drawings of the same symbol

## RES  0603  13K
designator R?, comment 13K
0603 13K 5% 贴片电阻; 物料代码: 3.01.03.01.01.0055; 仓库名称: 元件仓; 助记码: 0603 13K 5% TPDZ; 单位: ֻ; 加工方式: 贴片; 物料名称: 0603 13K 5% 贴片电阻; 规格型号: *
footprint R0603
pins: 1, 2
2 alternate drawings of the same symbol

## RES  0603  13R
designator R?, comment 13R
0603 13R 5% 贴片电阻; 物料代码: 3.01.03.01.01.0125; 助记码: 0603 13R 5% TPDZ; 仓库名称: 元件仓; 单位: ֻ; 加工方式: 贴片; 物料名称: 0603 13R 5% 贴片电阻; 规格型号: *
footprint R0603
pins: 1, 2
2 alternate drawings of the same symbol
